# Altium footprint library ST封装.PcbLib: 1336 footprints (part 82 of 109) (continued)
## SQFP14X20-152(T) [mm]
pads (152):
  rect 0.3x1.6 smd: 1(0,0)
  oval 0.3x1.6 smd: 2(-0.4,0) 3(-0.8,0) 4(-1.2,0) 5(-1.6,0) 6(-2,0) 7(-2.4,0) 8(-2.8,0) 9(-3.2,0) 10(-3.6,0) 11(-4,0) 12(-4.4,0) 13(-4.8,0) 14(-5.2,0) 15(-5.6,0) 62(-5.6,-21.4) 63(-5.2,-21.4) 64(-4.8,-21.4) 65(-4.4,-21.4) 66(-4,-21.4) 67(-3.6,-21.4) 68(-3.2,-21.4) 69(-2.8,-21.4) 70(-2.4,-21.4) 71(-2,-21.4) 72(-1.6,-21.4) 73(-1.2,-21.4) 74(-0.8,-21.4) 75(-0.4,-21.4) 76(0,-21.4) 77(0.4,-21.4) 78(0.8,-21.4) 79(1.2,-21.4) 80(1.6,-21.4) 81(2,-21.4) 82(2.4,-21.4) 83(2.8,-21.4) 84(3.2,-21.4) 85(3.6,-21.4) 86(4,-21.4) 87(4.4,-21.4) 88(4.8,-21.4) 89(5.2,-21.4) 90(5.6,-21.4) 91(6,-21.4) 138(6,0) 139(5.6,0) 140(5.2,0) 141(4.8,0) 142(4.4,0) 143(4,0) 144(3.6,0) 145(3.2,0) 146(2.8,0) 147(2.4,0) 148(2,0) 149(1.6,0) 150(1.2,0) 151(0.8,0) 152(0.4,0)
  oval 1.6x0.3 smd: 16(-7.5,-1.7) 17(-7.5,-2.1) 18(-7.5,-2.5) 19(-7.5,-2.9) 20(-7.5,-3.3) 21(-7.5,-3.7) 22(-7.5,-4.1) 23(-7.5,-4.5) 24(-7.5,-4.9) 25(-7.5,-5.3) 26(-7.5,-5.7) 27(-7.5,-6.1) 28(-7.5,-6.5) 29(-7.5,-6.9) 30(-7.5,-7.3) 31(-7.5,-7.7) 32(-7.5,-8.1) 33(-7.5,-8.5) 34(-7.5,-8.9) 35(-7.5,-9.3) 36(-7.5,-9.7) 37(-7.5,-10.1) 38(-7.5,-10.5) 39(-7.5,-10.9) 40(-7.5,-11.3) 41(-7.5,-11.7) 42(-7.5,-12.1) 43(-7.5,-12.5) 44(-7.5,-12.9) 45(-7.5,-13.3) 46(-7.5,-13.7) 47(-7.5,-14.1) 48(-7.5,-14.5) 49(-7.5,-14.9) 50(-7.5,-15.3) 51(-7.5,-15.7) 52(-7.5,-16.1) 53(-7.5,-16.5) 54(-7.5,-16.9) 55(-7.5,-17.3) 56(-7.5,-17.7) 57(-7.5,-18.1) 58(-7.5,-18.5) 59(-7.5,-18.9) 60(-7.5,-19.3) 61(-7.5,-19.7) 92(7.9,-19.7) 93(7.9,-19.3) 94(7.9,-18.9) 95(7.9,-18.5) 96(7.9,-18.1) 97(7.9,-17.7) 98(7.9,-17.3) 99(7.9,-16.9) 100(7.9,-16.5) 101(7.9,-16.1) 102(7.9,-15.7) 103(7.9,-15.3) 104(7.9,-14.9) 105(7.9,-14.5) 106(7.9,-14.1) 107(7.9,-13.7) 108(7.9,-13.3) 109(7.9,-12.9) 110(7.9,-12.5) 111(7.9,-12.1) 112(7.9,-11.7) 113(7.9,-11.3) 114(7.9,-10.9) 115(7.9,-10.5) 116(7.9,-10.1) 117(7.9,-9.7) 118(7.9,-9.3) 119(7.9,-8.9) 120(7.9,-8.5) 121(7.9,-8.1) 122(7.9,-7.7) 123(7.9,-7.3) 124(7.9,-6.9) 125(7.9,-6.5) 126(7.9,-6.1) 127(7.9,-5.7) 128(7.9,-5.3) 129(7.9,-4.9) 130(7.9,-4.5) 131(7.9,-4.1) 132(7.9,-3.7) 133(7.9,-3.3) 134(7.9,-2.9) 135(7.9,-2.5) 136(7.9,-2.1) 137(7.9,-1.7)
Top Overlay:
  lines w0.2: -7.9,-20.35 -7.9,-21.8 -6.25,-21.8 ; -7.9,-1.05 -7.9,-0.4 -7.1,0.4 -6.25,0.4 ; 6.65,-21.8 8.3,-21.8 8.3,-20.35 ; 6.65,0.4 8.3,0.4 8.3,-1.05

## SQFP14X20-160(N) [mm]
pads (160):
  rect 1.6x0.3 smd: 1(0,0)
  oval 1.6x0.3 smd: 2(0,-0.4) 3(0,-0.8) 4(0,-1.2) 5(0,-1.6) 6(0,-2) 7(0,-2.4) 8(0,-2.8) 9(0,-3.2) 10(0,-3.6) 11(0,-4) 12(0,-4.4) 13(0,-4.8) 14(0,-5.2) 15(0,-5.6) 16(0,-6) 17(0,-6.4) 18(0,-6.8) 19(0,-7.2) 20(0,-7.6) 21(0,-8) 22(0,-8.4) 23(0,-8.8) 24(0,-9.2) 25(0,-9.6) 26(0,-10) 27(0,-10.4) 28(0,-10.8) 29(0,-11.2) 30(0,-11.6) 31(0,-12) 32(0,-12.4) 33(0,-12.8) 34(0,-13.2) 35(0,-13.6) 36(0,-14) 37(0,-14.4) 38(0,-14.8) 39(0,-15.2) 40(0,-15.6) 41(0,-16) 42(0,-16.4) 43(0,-16.8) 44(0,-17.2) 45(0,-17.6) 46(0,-18) 47(0,-18.4) 48(0,-18.8) 81(15.4,-18.8) 82(15.4,-18.4) 83(15.4,-18) 84(15.4,-17.6) 85(15.4,-17.2) 86(15.4,-16.8) 87(15.4,-16.4) 88(15.4,-16) 89(15.4,-15.6) 90(15.4,-15.2) 91(15.4,-14.8) 92(15.4,-14.4) 93(15.4,-14) 94(15.4,-13.6) 95(15.4,-13.2) 96(15.4,-12.8) 97(15.4,-12.4) 98(15.4,-12) 99(15.4,-11.6) 100(15.4,-11.2) 101(15.4,-10.8) 102(15.4,-10.4) 103(15.4,-10) 104(15.4,-9.6) 105(15.4,-9.2) 106(15.4,-8.8) 107(15.4,-8.4) 108(15.4,-8) 109(15.4,-7.6) 110(15.4,-7.2) 111(15.4,-6.8) 112(15.4,-6.4) 113(15.4,-6) 114(15.4,-5.6) 115(15.4,-5.2) 116(15.4,-4.8) 117(15.4,-4.4) 118(15.4,-4) 119(15.4,-3.6) 120(15.4,-3.2) 121(15.4,-2.8) 122(15.4,-2.4) 123(15.4,-2) 124(15.4,-1.6) 125(15.4,-1.2) 126(15.4,-0.8) 127(15.4,-0.4) 128(15.4,0)
  oval 0.3x1.6 smd: 49(1.5,-20.1) 50(1.9,-20.1) 51(2.3,-20.1) 52(2.7,-20.1) 53(3.1,-20.1) 54(3.5,-20.1) 55(3.9,-20.1) 56(4.3,-20.1) 57(4.7,-20.1) 58(5.1,-20.1) 59(5.5,-20.1) 60(5.9,-20.1) 61(6.3,-20.1) 62(6.7,-20.1) 63(7.1,-20.1) 64(7.5,-20.1) 65(7.9,-20.1) 66(8.3,-20.1) 67(8.7,-20.1) 68(9.1,-20.1) 69(9.5,-20.1) 70(9.9,-20.1) 71(10.3,-20.1) 72(10.7,-20.1) 73(11.1,-20.1) 74(11.5,-20.1) 75(11.9,-20.1) 76(12.3,-20.1) 77(12.7,-20.1) 78(13.1,-20.1) 79(13.5,-20.1) 80(13.9,-20.1) 129(13.9,1.3) 130(13.5,1.3) 131(13.1,1.3) 132(12.7,1.3) 133(12.3,1.3) 134(11.9,1.3) 135(11.5,1.3) 136(11.1,1.3) 137(10.7,1.3) 138(10.3,1.3) 139(9.9,1.3) 140(9.5,1.3) 141(9.1,1.3) 142(8.7,1.3) 143(8.3,1.3) 144(7.9,1.3) 145(7.5,1.3) 146(7.1,1.3) 147(6.7,1.3) 148(6.3,1.3) 149(5.9,1.3) 150(5.5,1.3) 151(5.1,1.3) 152(4.7,1.3) 153(4.3,1.3) 154(3.9,1.3) 155(3.5,1.3) 156(3.1,1.3) 157(2.7,1.3) 158(2.3,1.3) 159(1.9,1.3) 160(1.5,1.3)
Top Overlay:
  lines w0.2: -0.4,-19.45 -0.4,-20.5 0.85,-20.5 ; -0.4,0.65 -0.4,0.9 0.4,1.7 0.85,1.7 ; 14.55,-20.5 15.8,-20.5 15.8,-19.45 ; 14.55,1.7 15.8,1.7 15.8,0.65

## SQFP14X20-160(T) [mm]
pads (160):
  rect 0.3x1.6 smd: 1(0,0)
  oval 0.3x1.6 smd: 2(-0.4,0) 3(-0.8,0) 4(-1.2,0) 5(-1.6,0) 6(-2,0) 7(-2.4,0) 8(-2.8,0) 9(-3.2,0) 10(-3.6,0) 11(-4,0) 12(-4.4,0) 13(-4.8,0) 14(-5.2,0) 15(-5.6,0) 16(-6,0) 65(-6,-21.4) 66(-5.6,-21.4) 67(-5.2,-21.4) 68(-4.8,-21.4) 69(-4.4,-21.4) 70(-4,-21.4) 71(-3.6,-21.4) 72(-3.2,-21.4) 73(-2.8,-21.4) 74(-2.4,-21.4) 75(-2,-21.4) 76(-1.6,-21.4) 77(-1.2,-21.4) 78(-0.8,-21.4) 79(-0.4,-21.4) 80(0,-21.4) 81(0.4,-21.4) 82(0.8,-21.4) 83(1.2,-21.4) 84(1.6,-21.4) 85(2,-21.4) 86(2.4,-21.4) 87(2.8,-21.4) 88(3.2,-21.4) 89(3.6,-21.4) 90(4,-21.4) 91(4.4,-21.4) 92(4.8,-21.4) 93(5.2,-21.4) 94(5.6,-21.4) 95(6,-21.4) 96(6.4,-21.4) 145(6.4,0) 146(6,0) 147(5.6,0) 148(5.2,0) 149(4.8,0) 150(4.4,0) 151(4,0) 152(3.6,0) 153(3.2,0) 154(2.8,0) 155(2.4,0) 156(2,0) 157(1.6,0) 158(1.2,0) 159(0.8,0) 160(0.4,0)
  oval 1.6x0.3 smd: 17(-7.5,-1.3) 18(-7.5,-1.7) 19(-7.5,-2.1) 20(-7.5,-2.5) 21(-7.5,-2.9) 22(-7.5,-3.3) 23(-7.5,-3.7) 24(-7.5,-4.1) 25(-7.5,-4.5) 26(-7.5,-4.9) 27(-7.5,-5.3) 28(-7.5,-5.7) 29(-7.5,-6.1) 30(-7.5,-6.5) 31(-7.5,-6.9) 32(-7.5,-7.3) 33(-7.5,-7.7) 34(-7.5,-8.1) 35(-7.5,-8.5) 36(-7.5,-8.9) 37(-7.5,-9.3) 38(-7.5,-9.7) 39(-7.5,-10.1) 40(-7.5,-10.5) 41(-7.5,-10.9) 42(-7.5,-11.3) 43(-7.5,-11.7) 44(-7.5,-12.1) 45(-7.5,-12.5) 46(-7.5,-12.9) 47(-7.5,-13.3) 48(-7.5,-13.7) 49(-7.5,-14.1) 50(-7.5,-14.5) 51(-7.5,-14.9) 52(-7.5,-15.3) 53(-7.5,-15.7) 54(-7.5,-16.1) 55(-7.5,-16.5) 56(-7.5,-16.9) 57(-7.5,-17.3) 58(-7.5,-17.7) 59(-7.5,-18.1) 60(-7.5,-18.5) 61(-7.5,-18.9) 62(-7.5,-19.3) 63(-7.5,-19.7) 64(-7.5,-20.1) 97(7.9,-20.1) 98(7.9,-19.7) 99(7.9,-19.3) 100(7.9,-18.9) 101(7.9,-18.5) 102(7.9,-18.1) 103(7.9,-17.7) 104(7.9,-17.3) 105(7.9,-16.9) 106(7.9,-16.5) 107(7.9,-16.1) 108(7.9,-15.7) 109(7.9,-15.3) 110(7.9,-14.9) 111(7.9,-14.5) 112(7.9,-14.1) 113(7.9,-13.7) 114(7.9,-13.3) 115(7.9,-12.9) 116(7.9,-12.5) 117(7.9,-12.1) 118(7.9,-11.7) 119(7.9,-11.3) 120(7.9,-10.9) 121(7.9,-10.5) 122(7.9,-10.1) 123(7.9,-9.7) 124(7.9,-9.3) 125(7.9,-8.9) 126(7.9,-8.5) 127(7.9,-8.1) 128(7.9,-7.7) 129(7.9,-7.3) 130(7.9,-6.9) 131(7.9,-6.5) 132(7.9,-6.1) 133(7.9,-5.7) 134(7.9,-5.3) 135(7.9,-4.9) 136(7.9,-4.5) 137(7.9,-4.1) 138(7.9,-3.7) 139(7.9,-3.3) 140(7.9,-2.9) 141(7.9,-2.5) 142(7.9,-2.1) 143(7.9,-1.7) 144(7.9,-1.3)
Top Overlay:
  lines w0.2: -7.9,-20.75 -7.9,-21.8 -6.65,-21.8 ; -7.9,-0.65 -7.9,-0.4 -7.1,0.4 -6.65,0.4 ; 7.05,-21.8 8.3,-21.8 8.3,-20.75 ; 7.05,0.4 8.3,0.4 8.3,-0.65

## SQFP14X20-208(N) [mm]
pads (208):
  rect 1.6x0.2 smd: 1(0,0)
  oval 1.6x0.2 smd: 2(0,-0.3) 3(0,-0.6) 4(0,-0.9) 5(0,-1.2) 6(0,-1.5) 7(0,-1.8) 8(0,-2.1) 9(0,-2.4) 10(0,-2.7) 11(0,-3) 12(0,-3.3) 13(0,-3.6) 14(0,-3.9) 15(0,-4.2) 16(0,-4.5) 17(0,-4.8) 18(0,-5.1) 19(0,-5.4) 20(0,-5.7) 21(0,-6) 22(0,-6.3) 23(0,-6.6) 24(0,-6.9) 25(0,-7.2) 26(0,-7.5) 27(0,-7.8) 28(0,-8.1) 29(0,-8.4) 30(0,-8.7) 31(0,-9) 32(0,-9.3) 33(0,-9.6) 34(0,-9.9) 35(0,-10.2) 36(0,-10.5) 37(0,-10.8) 38(0,-11.1) 39(0,-11.4) 40(0,-11.7) 41(0,-12) 42(0,-12.3) 43(0,-12.6) 44(0,-12.9) 45(0,-13.2) 46(0,-13.5) 47(0,-13.8) 48(0,-14.1) 49(0,-14.4) 50(0,-14.7) 51(0,-15) 52(0,-15.3) 53(0,-15.6) 54(0,-15.9) 55(0,-16.2) 56(0,-16.5) 57(0,-16.8) 58(0,-17.1) 59(0,-17.4) 60(0,-17.7) 61(0,-18) 62(0,-18.3) 105(15.4,-18.3) 106(15.4,-18) 107(15.4,-17.7) 108(15.4,-17.4) 109(15.4,-17.1) 110(15.4,-16.8) 111(15.4,-16.5) 112(15.4,-16.2) 113(15.4,-15.9) 114(15.4,-15.6) 115(15.4,-15.3) 116(15.4,-15) 117(15.4,-14.7) 118(15.4,-14.4) 119(15.4,-14.1) 120(15.4,-13.8) 121(15.4,-13.5) 122(15.4,-13.2) 123(15.4,-12.9) 124(15.4,-12.6) 125(15.4,-12.3) 126(15.4,-12) 127(15.4,-11.7) 128(15.4,-11.4) 129(15.4,-11.1) 130(15.4,-10.8) 131(15.4,-10.5) 132(15.4,-10.2) 133(15.4,-9.9) 134(15.4,-9.6) 135(15.4,-9.3) 136(15.4,-9) 137(15.4,-8.7) 138(15.4,-8.4) 139(15.4,-8.1) 140(15.4,-7.8) 141(15.4,-7.5) 142(15.4,-7.2) 143(15.4,-6.9) 144(15.4,-6.6) 145(15.4,-6.3) 146(15.4,-6) 147(15.4,-5.7) 148(15.4,-5.4) 149(15.4,-5.1) 150(15.4,-4.8) 151(15.4,-4.5) 152(15.4,-4.2) 153(15.4,-3.9) 154(15.4,-3.6) 155(15.4,-3.3) 156(15.4,-3) 157(15.4,-2.7) 158(15.4,-2.4) 159(15.4,-2.1) 160(15.4,-1.8) 161(15.4,-1.5) 162(15.4,-1.2) 163(15.4,-0.9) 164(15.4,-0.6) 165(15.4,-0.3) 166(15.4,0)
  oval 0.2x1.6 smd: 63(1.55,-19.85) 64(1.85,-19.85) 65(2.15,-19.85) 66(2.45,-19.85) 67(2.75,-19.85) 68(3.05,-19.85) 69(3.35,-19.85) 70(3.65,-19.85) 71(3.95,-19.85) 72(4.25,-19.85) 73(4.55,-19.85) 74(4.85,-19.85) 75(5.15,-19.85) 76(5.45,-19.85) 77(5.75,-19.85) 78(6.05,-19.85) 79(6.35,-19.85) 80(6.65,-19.85) 81(6.95,-19.85) 82(7.25,-19.85) 83(7.55,-19.85) 84(7.85,-19.85) 85(8.15,-19.85) 86(8.45,-19.85) 87(8.75,-19.85) 88(9.05,-19.85) 89(9.35,-19.85) 90(9.65,-19.85) 91(9.95,-19.85) 92(10.25,-19.85) 93(10.55,-19.85) 94(10.85,-19.85) 95(11.15,-19.85) 96(11.45,-19.85) 97(11.75,-19.85) 98(12.05,-19.85) 99(12.35,-19.85) 100(12.65,-19.85) 101(12.95,-19.85) 102(13.25,-19.85) 103(13.55,-19.85) 104(13.85,-19.85) 167(13.85,1.55) 168(13.55,1.55) 169(13.25,1.55) 170(12.95,1.55) 171(12.65,1.55) 172(12.35,1.55) 173(12.05,1.55) 174(11.75,1.55) 175(11.45,1.55) 176(11.15,1.55) 177(10.85,1.55) 178(10.55,1.55) 179(10.25,1.55) 180(9.95,1.55) 181(9.65,1.55) 182(9.35,1.55) 183(9.05,1.55) 184(8.75,1.55) 185(8.45,1.55) 186(8.15,1.55) 187(7.85,1.55) 188(7.55,1.55) 189(7.25,1.55) 190(6.95,1.55) 191(6.65,1.55) 192(6.35,1.55) 193(6.05,1.55) 194(5.75,1.55) 195(5.45,1.55) 196(5.15,1.55) 197(4.85,1.55) 198(4.55,1.55) 199(4.25,1.55) 200(3.95,1.55) 201(3.65,1.55) 202(3.35,1.55) 203(3.05,1.55) 204(2.75,1.55) 205(2.45,1.55) 206(2.15,1.55) 207(1.85,1.55) 208(1.55,1.55)
Top Overlay:
  lines w0.2: -0.4,-18.9 -0.4,-20.25 0.95,-20.25 ; -0.4,0.6 -0.4,1.15 0.4,1.95 0.95,1.95 ; 14.45,-20.25 15.8,-20.25 15.8,-18.9 ; 14.45,1.95 15.8,1.95 15.8,0.6

## SQFP14X20-216(N) [mm]
pads (216):
  rect 1.6x0.2 smd: 1(0,0)
  oval 1.6x0.2 smd: 2(0,-0.3) 3(0,-0.6) 4(0,-0.9) 5(0,-1.2) 6(0,-1.5) 7(0,-1.8) 8(0,-2.1) 9(0,-2.4) 10(0,-2.7) 11(0,-3) 12(0,-3.3) 13(0,-3.6) 14(0,-3.9) 15(0,-4.2) 16(0,-4.5) 17(0,-4.8) 18(0,-5.1) 19(0,-5.4) 20(0,-5.7) 21(0,-6) 22(0,-6.3) 23(0,-6.6) 24(0,-6.9) 25(0,-7.2) 26(0,-7.5) 27(0,-7.8) 28(0,-8.1) 29(0,-8.4) 30(0,-8.7) 31(0,-9) 32(0,-9.3) 33(0,-9.6) 34(0,-9.9) 35(0,-10.2) 36(0,-10.5) 37(0,-10.8) 38(0,-11.1) 39(0,-11.4) 40(0,-11.7) 41(0,-12) 42(0,-12.3) 43(0,-12.6) 44(0,-12.9) 45(0,-13.2) 46(0,-13.5) 47(0,-13.8) 48(0,-14.1) 49(0,-14.4) 50(0,-14.7) 51(0,-15) 52(0,-15.3) 53(0,-15.6) 54(0,-15.9) 55(0,-16.2) 56(0,-16.5) 57(0,-16.8) 58(0,-17.1) 59(0,-17.4) 60(0,-17.7) 61(0,-18) 62(0,-18.3) 63(0,-18.6) 64(0,-18.9) 109(15.4,-18.9) 110(15.4,-18.6) 111(15.4,-18.3) 112(15.4,-18) 113(15.4,-17.7) 114(15.4,-17.4) 115(15.4,-17.1) 116(15.4,-16.8) 117(15.4,-16.5) 118(15.4,-16.2) 119(15.4,-15.9) 120(15.4,-15.6) 121(15.4,-15.3) 122(15.4,-15) 123(15.4,-14.7) 124(15.4,-14.4) 125(15.4,-14.1) 126(15.4,-13.8) 127(15.4,-13.5) 128(15.4,-13.2) 129(15.4,-12.9) 130(15.4,-12.6) 131(15.4,-12.3) 132(15.4,-12) 133(15.4,-11.7) 134(15.4,-11.4) 135(15.4,-11.1) 136(15.4,-10.8) 137(15.4,-10.5) 138(15.4,-10.2) 139(15.4,-9.9) 140(15.4,-9.6) 141(15.4,-9.3) 142(15.4,-9) 143(15.4,-8.7) 144(15.4,-8.4) 145(15.4,-8.1) 146(15.4,-7.8) 147(15.4,-7.5) 148(15.4,-7.2) 149(15.4,-6.9) 150(15.4,-6.6) 151(15.4,-6.3) 152(15.4,-6) 153(15.4,-5.7) 154(15.4,-5.4) 155(15.4,-5.1) 156(15.4,-4.8) 157(15.4,-4.5) 158(15.4,-4.2) 159(15.4,-3.9) 160(15.4,-3.6) 161(15.4,-3.3) 162(15.4,-3) 163(15.4,-2.7) 164(15.4,-2.4) 165(15.4,-2.1) 166(15.4,-1.8) 167(15.4,-1.5) 168(15.4,-1.2) 169(15.4,-0.9) 170(15.4,-0.6) 171(15.4,-0.3) 172(15.4,0)
  oval 0.2x1.6 smd: 65(1.25,-20.15) 66(1.55,-20.15) 67(1.85,-20.15) 68(2.15,-20.15) 69(2.45,-20.15) 70(2.75,-20.15) 71(3.05,-20.15) 72(3.35,-20.15) 73(3.65,-20.15) 74(3.95,-20.15) 75(4.25,-20.15) 76(4.55,-20.15) 77(4.85,-20.15) 78(5.15,-20.15) 79(5.45,-20.15) 80(5.75,-20.15) 81(6.05,-20.15) 82(6.35,-20.15) 83(6.65,-20.15) 84(6.95,-20.15) 85(7.25,-20.15) 86(7.55,-20.15) 87(7.85,-20.15) 88(8.15,-20.15) 89(8.45,-20.15) 90(8.75,-20.15) 91(9.05,-20.15) 92(9.35,-20.15) 93(9.65,-20.15) 94(9.95,-20.15) 95(10.25,-20.15) 96(10.55,-20.15) 97(10.85,-20.15) 98(11.15,-20.15) 99(11.45,-20.15) 100(11.75,-20.15) 101(12.05,-20.15) 102(12.35,-20.15) 103(12.65,-20.15) 104(12.95,-20.15) 105(13.25,-20.15) 106(13.55,-20.15) 107(13.85,-20.15) 108(14.15,-20.15) 173(14.15,1.25) 174(13.85,1.25) 175(13.55,1.25) 176(13.25,1.25) 177(12.95,1.25) 178(12.65,1.25) 179(12.35,1.25) 180(12.05,1.25) 181(11.75,1.25) 182(11.45,1.25) 183(11.15,1.25) 184(10.85,1.25) 185(10.55,1.25) 186(10.25,1.25) 187(9.95,1.25) 188(9.65,1.25) 189(9.35,1.25) 190(9.05,1.25) 191(8.75,1.25) 192(8.45,1.25) 193(8.15,1.25) 194(7.85,1.25) 195(7.55,1.25) 196(7.25,1.25) 197(6.95,1.25) 198(6.65,1.25) 199(6.35,1.25) 200(6.05,1.25) 201(5.75,1.25) 202(5.45,1.25) 203(5.15,1.25) 204(4.85,1.25) 205(4.55,1.25) 206(4.25,1.25) 207(3.95,1.25) 208(3.65,1.25) 209(3.35,1.25) 210(3.05,1.25) 211(2.75,1.25) 212(2.45,1.25) 213(2.15,1.25) 214(1.85,1.25) 215(1.55,1.25) 216(1.25,1.25)
Top Overlay:
  lines w0.2: -0.4,-19.5 -0.4,-20.55 0.65,-20.55 ; -0.4,0.6 -0.4,0.85 0.4,1.65 0.65,1.65 ; 14.75,-20.55 15.8,-20.55 15.8,-19.5 ; 14.75,1.65 15.8,1.65 15.8,0.6

## SQFP14X20-216(T) [mm]
pads (216):
  rect 0.2x1.6 smd: 1(0,0)
  oval 0.2x1.6 smd: 2(-0.3,0) 3(-0.6,0) 4(-0.9,0) 5(-1.2,0) 6(-1.5,0) 7(-1.8,0) 8(-2.1,0) 9(-2.4,0) 10(-2.7,0) 11(-3,0) 12(-3.3,0) 13(-3.6,0) 14(-3.9,0) 15(-4.2,0) 16(-4.5,0) 17(-4.8,0) 18(-5.1,0) 19(-5.4,0) 20(-5.7,0) 21(-6,0) 22(-6.3,0) 87(-6.3,-21.4) 88(-6,-21.4) 89(-5.7,-21.4) 90(-5.4,-21.4) 91(-5.1,-21.4) 92(-4.8,-21.4) 93(-4.5,-21.4) 94(-4.2,-21.4) 95(-3.9,-21.4) 96(-3.6,-21.4) 97(-3.3,-21.4) 98(-3,-21.4) 99(-2.7,-21.4) 100(-2.4,-21.4) 101(-2.1,-21.4) 102(-1.8,-21.4) 103(-1.5,-21.4) 104(-1.2,-21.4) 105(-0.9,-21.4) 106(-0.6,-21.4) 107(-0.3,-21.4) 108(0,-21.4) 109(0.3,-21.4) 110(0.6,-21.4) 111(0.9,-21.4) 112(1.2,-21.4) 113(1.5,-21.4) 114(1.8,-21.4) 115(2.1,-21.4) 116(2.4,-21.4) 117(2.7,-21.4) 118(3,-21.4) 119(3.3,-21.4) 120(3.6,-21.4) 121(3.9,-21.4) 122(4.2,-21.4) 123(4.5,-21.4) 124(4.8,-21.4) 125(5.1,-21.4) 126(5.4,-21.4) 127(5.7,-21.4) 128(6,-21.4) 129(6.3,-21.4) 130(6.6,-21.4) 195(6.6,0) 196(6.3,0) 197(6,0) 198(5.7,0) 199(5.4,0) 200(5.1,0) 201(4.8,0) 202(4.5,0) 203(4.2,0) 204(3.9,0) 205(3.6,0) 206(3.3,0) 207(3,0) 208(2.7,0) 209(2.4,0) 210(2.1,0) 211(1.8,0) 212(1.5,0) 213(1.2,0) 214(0.9,0) 215(0.6,0) 216(0.3,0)
  oval 1.6x0.2 smd: 23(-7.55,-1.25) 24(-7.55,-1.55) 25(-7.55,-1.85) 26(-7.55,-2.15) 27(-7.55,-2.45) 28(-7.55,-2.75) 29(-7.55,-3.05) 30(-7.55,-3.35) 31(-7.55,-3.65) 32(-7.55,-3.95) 33(-7.55,-4.25) 34(-7.55,-4.55) 35(-7.55,-4.85) 36(-7.55,-5.15) 37(-7.55,-5.45) 38(-7.55,-5.75) 39(-7.55,-6.05) 40(-7.55,-6.35) 41(-7.55,-6.65) 42(-7.55,-6.95) 43(-7.55,-7.25) 44(-7.55,-7.55) 45(-7.55,-7.85) 46(-7.55,-8.15) 47(-7.55,-8.45) 48(-7.55,-8.75) 49(-7.55,-9.05) 50(-7.55,-9.35) 51(-7.55,-9.65) 52(-7.55,-9.95) 53(-7.55,-10.25) 54(-7.55,-10.55) 55(-7.55,-10.85) 56(-7.55,-11.15) 57(-7.55,-11.45) 58(-7.55,-11.75) 59(-7.55,-12.05) 60(-7.55,-12.35) 61(-7.55,-12.65) 62(-7.55,-12.95) 63(-7.55,-13.25) 64(-7.55,-13.55) 65(-7.55,-13.85) 66(-7.55,-14.15) 67(-7.55,-14.45) 68(-7.55,-14.75) 69(-7.55,-15.05) 70(-7.55,-15.35) 71(-7.55,-15.65) 72(-7.55,-15.95) 73(-7.55,-16.25) 74(-7.55,-16.55) 75(-7.55,-16.85) 76(-7.55,-17.15) 77(-7.55,-17.45) 78(-7.55,-17.75) 79(-7.55,-18.05) 80(-7.55,-18.35) 81(-7.55,-18.65) 82(-7.55,-18.95) 83(-7.55,-19.25) 84(-7.55,-19.55) 85(-7.55,-19.85) 86(-7.55,-20.15) 131(7.85,-20.15) 132(7.85,-19.85) 133(7.85,-19.55) 134(7.85,-19.25) 135(7.85,-18.95) 136(7.85,-18.65) 137(7.85,-18.35) 138(7.85,-18.05) 139(7.85,-17.75) 140(7.85,-17.45) 141(7.85,-17.15) 142(7.85,-16.85) 143(7.85,-16.55) 144(7.85,-16.25) 145(7.85,-15.95) 146(7.85,-15.65) 147(7.85,-15.35) 148(7.85,-15.05) 149(7.85,-14.75) 150(7.85,-14.45) 151(7.85,-14.15) 152(7.85,-13.85) 153(7.85,-13.55) 154(7.85,-13.25) 155(7.85,-12.95) 156(7.85,-12.65) 157(7.85,-12.35) 158(7.85,-12.05) 159(7.85,-11.75) 160(7.85,-11.45) 161(7.85,-11.15) 162(7.85,-10.85) 163(7.85,-10.55) 164(7.85,-10.25) 165(7.85,-9.95) 166(7.85,-9.65) 167(7.85,-9.35) 168(7.85,-9.05) 169(7.85,-8.75) 170(7.85,-8.45) 171(7.85,-8.15) 172(7.85,-7.85) 173(7.85,-7.55) 174(7.85,-7.25) 175(7.85,-6.95) 176(7.85,-6.65) 177(7.85,-6.35) 178(7.85,-6.05) 179(7.85,-5.75) 180(7.85,-5.45) 181(7.85,-5.15) 182(7.85,-4.85) 183(7.85,-4.55) 184(7.85,-4.25) 185(7.85,-3.95) 186(7.85,-3.65) 187(7.85,-3.35) 188(7.85,-3.05) 189(7.85,-2.75) 190(7.85,-2.45) 191(7.85,-2.15) 192(7.85,-1.85) 193(7.85,-1.55) 194(7.85,-1.25)
Top Overlay:
  lines w0.2: -7.95,-20.75 -7.95,-21.8 -6.9,-21.8 ; -7.95,-0.65 -7.95,-0.4 -7.15,0.4 -6.9,0.4 ; 7.2,-21.8 8.25,-21.8 8.25,-20.75 ; 7.2,0.4 8.25,0.4 8.25,-0.65

## SQFP20X20-248(N) [mm]
pads (248):
  rect 1.6x0.2 smd: 1(0,0)
  oval 1.6x0.2 smd: 2(0,-0.3) 3(0,-0.6) 4(0,-0.9) 5(0,-1.2) 6(0,-1.5) 7(0,-1.8) 8(0,-2.1) 9(0,-2.4) 10(0,-2.7) 11(0,-3) 12(0,-3.3) 13(0,-3.6) 14(0,-3.9) 15(0,-4.2) 16(0,-4.5) 17(0,-4.8) 18(0,-5.1) 19(0,-5.4) 20(0,-5.7) 21(0,-6) 22(0,-6.3) 23(0,-6.6) 24(0,-6.9) 25(0,-7.2) 26(0,-7.5) 27(0,-7.8) 28(0,-8.1) 29(0,-8.4) 30(0,-8.7) 31(0,-9) 32(0,-9.3) 33(0,-9.6) 34(0,-9.9) 35(0,-10.2) 36(0,-10.5) 37(0,-10.8) 38(0,-11.1) 39(0,-11.4) 40(0,-11.7) 41(0,-12) 42(0,-12.3) 43(0,-12.6) 44(0,-12.9) 45(0,-13.2) 46(0,-13.5) 47(0,-13.8) 48(0,-14.1) 49(0,-14.4) 50(0,-14.7) 51(0,-15) 52(0,-15.3) 53(0,-15.6) 54(0,-15.9) 55(0,-16.2) 56(0,-16.5) 57(0,-16.8) 58(0,-17.1) 59(0,-17.4) 60(0,-17.7) 61(0,-18) 62(0,-18.3) 125(21.4,-18.3) 126(21.4,-18) 127(21.4,-17.7) 128(21.4,-17.4) 129(21.4,-17.1) 130(21.4,-16.8) 131(21.4,-16.5) 132(21.4,-16.2) 133(21.4,-15.9) 134(21.4,-15.6) 135(21.4,-15.3) 136(21.4,-15) 137(21.4,-14.7) 138(21.4,-14.4) 139(21.4,-14.1) 140(21.4,-13.8) 141(21.4,-13.5) 142(21.4,-13.2) 143(21.4,-12.9) 144(21.4,-12.6) 145(21.4,-12.3) 146(21.4,-12) 147(21.4,-11.7) 148(21.4,-11.4) 149(21.4,-11.1) 150(21.4,-10.8) 151(21.4,-10.5) 152(21.4,-10.2) 153(21.4,-9.9) 154(21.4,-9.6) 155(21.4,-9.3) 156(21.4,-9) 157(21.4,-8.7) 158(21.4,-8.4) 159(21.4,-8.1) 160(21.4,-7.8) 161(21.4,-7.5) 162(21.4,-7.2) 163(21.4,-6.9) 164(21.4,-6.6) 165(21.4,-6.3) 166(21.4,-6) 167(21.4,-5.7) 168(21.4,-5.4) 169(21.4,-5.1) 170(21.4,-4.8) 171(21.4,-4.5) 172(21.4,-4.2) 173(21.4,-3.9) 174(21.4,-3.6) 175(21.4,-3.3) 176(21.4,-3) 177(21.4,-2.7) 178(21.4,-2.4) 179(21.4,-2.1) 180(21.4,-1.8) 181(21.4,-1.5) 182(21.4,-1.2) 183(21.4,-0.9) 184(21.4,-0.6) 185(21.4,-0.3) 186(21.4,0)
  oval 0.2x1.6 smd: 63(1.55,-19.85) 64(1.85,-19.85) 65(2.15,-19.85) 66(2.45,-19.85) 67(2.75,-19.85) 68(3.05,-19.85) 69(3.35,-19.85) 70(3.65,-19.85) 71(3.95,-19.85) 72(4.25,-19.85) 73(4.55,-19.85) 74(4.85,-19.85) 75(5.15,-19.85) 76(5.45,-19.85) 77(5.75,-19.85) 78(6.05,-19.85) 79(6.35,-19.85) 80(6.65,-19.85) 81(6.95,-19.85) 82(7.25,-19.85) 83(7.55,-19.85) 84(7.85,-19.85) 85(8.15,-19.85) 86(8.45,-19.85) 87(8.75,-19.85) 88(9.05,-19.85) 89(9.35,-19.85) 90(9.65,-19.85) 91(9.95,-19.85) 92(10.25,-19.85) 93(10.55,-19.85) 94(10.85,-19.85) 95(11.15,-19.85) 96(11.45,-19.85) 97(11.75,-19.85) 98(12.05,-19.85) 99(12.35,-19.85) 100(12.65,-19.85) 101(12.95,-19.85) 102(13.25,-19.85) 103(13.55,-19.85) 104(13.85,-19.85) 105(14.15,-19.85) 106(14.45,-19.85) 107(14.75,-19.85) 108(15.05,-19.85) 109(15.35,-19.85) 110(15.65,-19.85) 111(15.95,-19.85) 112(16.25,-19.85) 113(16.55,-19.85) 114(16.85,-19.85) 115(17.15,-19.85) 116(17.45,-19.85) 117(17.75,-19.85) 118(18.05,-19.85) 119(18.35,-19.85) 120(18.65,-19.85) 121(18.95,-19.85) 122(19.25,-19.85) 123(19.55,-19.85) 124(19.85,-19.85) 187(19.85,1.55) 188(19.55,1.55) 189(19.25,1.55) 190(18.95,1.55) 191(18.65,1.55) 192(18.35,1.55) 193(18.05,1.55) 194(17.75,1.55) 195(17.45,1.55) 196(17.15,1.55) 197(16.85,1.55) 198(16.55,1.55) 199(16.25,1.55) 200(15.95,1.55) 201(15.65,1.55) 202(15.35,1.55) 203(15.05,1.55) 204(14.75,1.55) 205(14.45,1.55) 206(14.15,1.55) 207(13.85,1.55) 208(13.55,1.55) 209(13.25,1.55) 210(12.95,1.55) 211(12.65,1.55) 212(12.35,1.55) 213(12.05,1.55) 214(11.75,1.55) 215(11.45,1.55) 216(11.15,1.55) 217(10.85,1.55) 218(10.55,1.55) 219(10.25,1.55) 220(9.95,1.55) 221(9.65,1.55) 222(9.35,1.55) 223(9.05,1.55) 224(8.75,1.55) 225(8.45,1.55) 226(8.15,1.55) 227(7.85,1.55) 228(7.55,1.55) 229(7.25,1.55) 230(6.95,1.55) 231(6.65,1.55) 232(6.35,1.55) 233(6.05,1.55) 234(5.75,1.55) 235(5.45,1.55) 236(5.15,1.55) 237(4.85,1.55) 238(4.55,1.55) 239(4.25,1.55) 240(3.95,1.55) 241(3.65,1.55) 242(3.35,1.55) 243(3.05,1.55) 244(2.75,1.55) 245(2.45,1.55) 246(2.15,1.55) 247(1.85,1.55) 248(1.55,1.55)
Top Overlay:
  lines w0.2: -0.4,-18.9 -0.4,-20.25 0.95,-20.25 ; -0.4,0.6 -0.4,1.15 0.4,1.95 0.95,1.95 ; 20.45,-20.25 21.8,-20.25 21.8,-18.9 ; 20.45,1.95 21.8,1.95 21.8,0.6